# Altium footprint library BWRC.PcbLib: 51 footprints (part 1 of 4)
Each footprint in its own frame and in the unit in brackets; x right, y up, seen from the top. Pads: shape width x height; smd on the part's side, far side on the other; paste and mask are expansions set on the pad; w line width, h text height; cw(c..) or ccw(c..) is an arc to the next point about the centre after c.
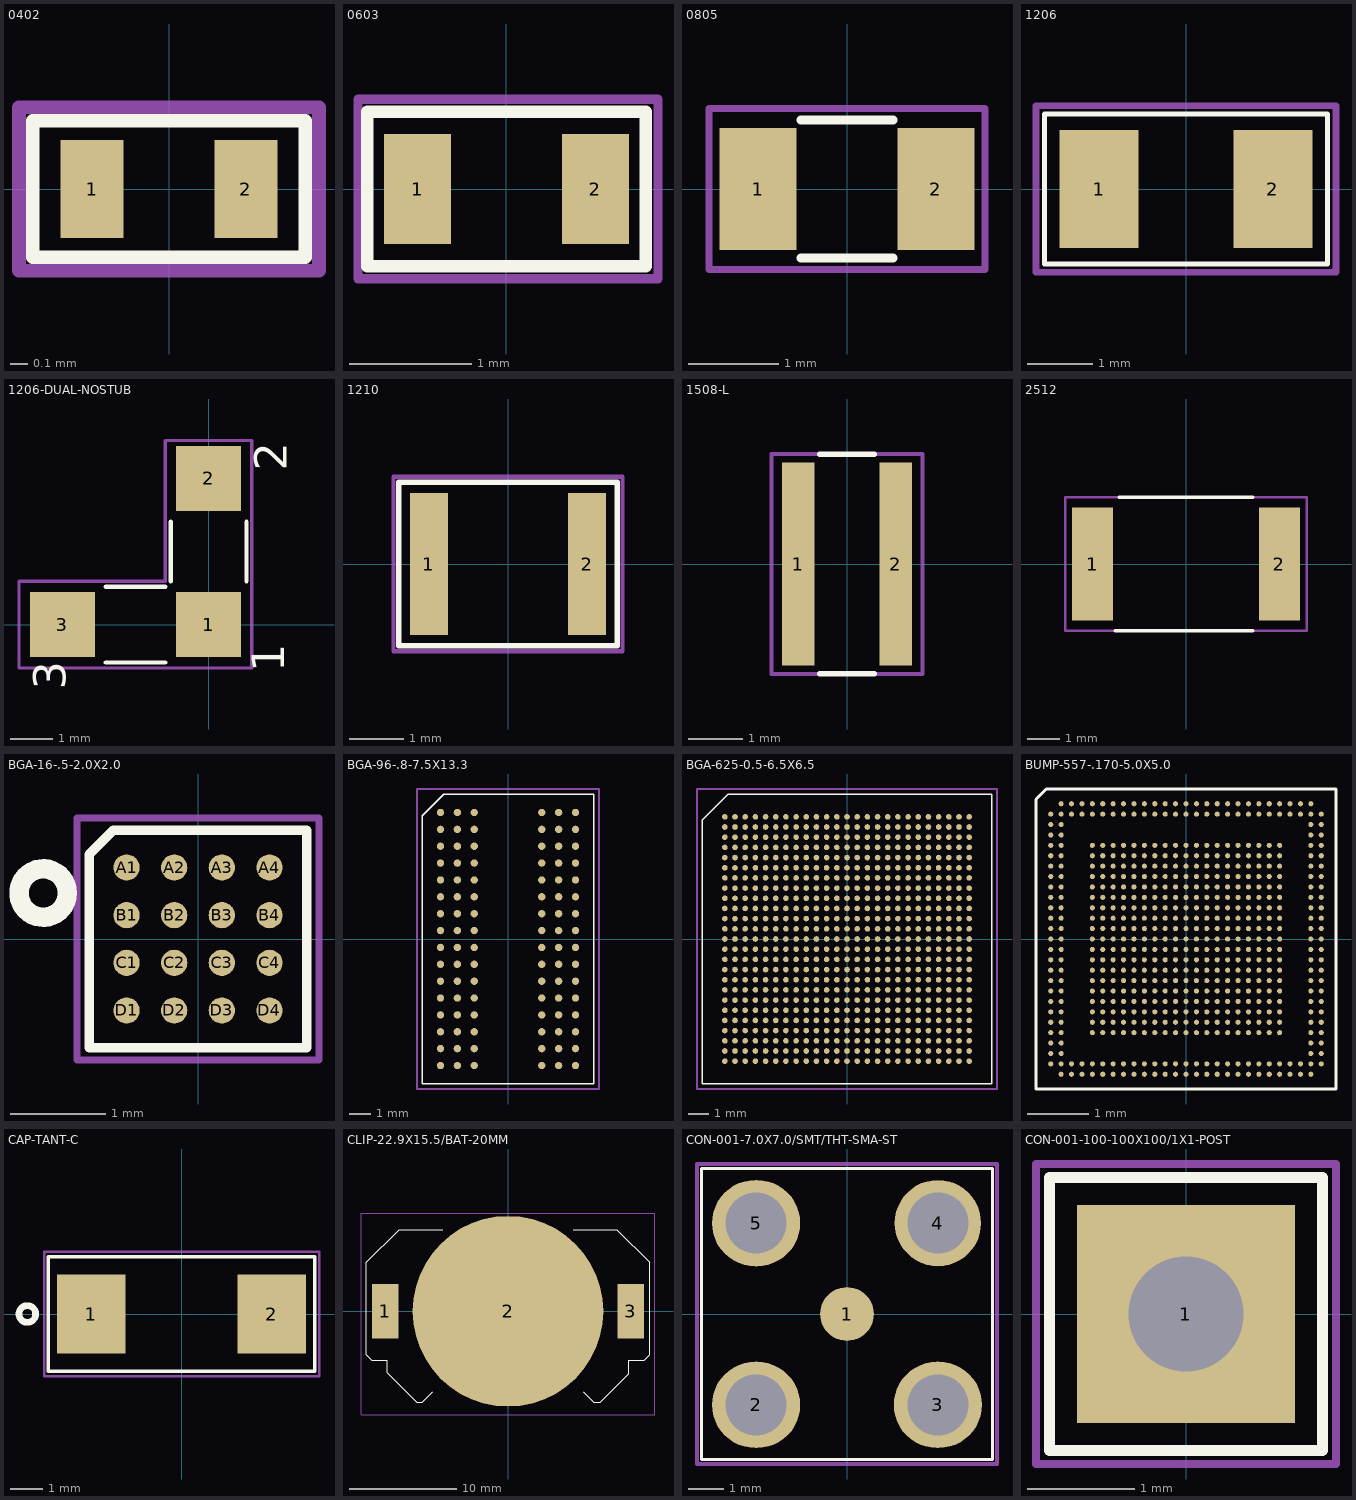
[diagram p0: the footprints below, top view; thin cyan lines are the x and y axes]

## 0402 [mm]
pads (2):
  rect 0.35x0.55 smd: 1(-0.43,0) 2(0.43,0)
Top Overlay:
  lines w0.076: -0.762,-0.381 0.762,-0.381 0.762,0.381 -0.762,0.381 -0.762,-0.381
M15_Courtyard_Top:
  lines w0.076: -0.838,-0.457 0.838,-0.457 0.838,0.457 -0.838,0.457 -0.838,-0.457

## 0603 [mm]
pads (2):
  rect 0.55x0.9 smd: 1(-0.73,0) 2(0.73,0)
Top Overlay:
  lines w0.102: -1.143,-0.635 -1.143,0.635 1.143,0.635 1.143,-0.635 -1.143,-0.635
M15_Courtyard_Top:
  lines w0.076: -1.219,-0.737 1.245,-0.737 1.245,0.737 -1.219,0.737 -1.219,-0.737

## 0805 [mm]
pads (2):
  rect 0.85x1.35 smd: 1(-0.98,0) 2(0.98,0)
Top Overlay:
  lines w0.102: -0.508,-0.762 0.508,-0.762 ; -0.508,0.762 0.508,0.762
M15_Courtyard_Top:
  lines w0.076: -1.524,-0.889 -1.524,-0.127 -1.524,0.889 1.524,0.889 1.524,-0.889 -1.524,-0.889

## 1206 [mm]
pads (2):
  rect 1.2x1.8 smd: 1(-1.325,0) 2(1.325,0)
Top Overlay:
  lines w0.076: -2.159,-1.143 -2.159,1.143 2.159,1.143 2.159,-1.143 -2.159,-1.143
M15_Courtyard_Top:
  lines w0.102: -2.286,-1.27 2.286,-1.27 2.286,1.27 -2.286,1.27 -2.286,-1.27

## 1206-DUAL-NOSTUB [mil]
height 43.31
pads (3):
  rect 60x60 smd: 1(0,-0.02) 2(0,134.98) 3(-135,-0.02)
Top Overlay:
  lines w4: -95,-35 -40,-35 ; -95,35 -40,35 ; -35,40 -35,95 ; 35,40 35,95
  text "2" at 72,142 h30
  text "3" at -132,-60 h30
  text "1" at 70,-44 h30
M15_Courtyard_Top:
  lines w3: -175,-40 -175,40 -40,40 -40,170 40,170 40,-40 -175,-40

## 1210 [mm]
pads (2):
  rect 0.7x2.6 smd: 1(-1.45,0) 2(1.45,0)
Top Overlay:
  lines w0.102: -2,-1.5 2,-1.5 2,1.5 -2,1.5 -2,-1.5
M15_Courtyard_Top:
  lines w0.076: -2.1,-1.6 -2.1,1.6 2.1,1.6 2.1,-1.6 -2.1,-1.6

## 1508-L [mm]
pads (2):
  rect 0.6x3.75 smd: 1(-0.9,0) 2(0.9,0)
Top Overlay:
  lines w0.102: -0.508,-2.032 0.508,-2.032 ; -0.508,2.032 0.508,2.032
M15_Courtyard_Top:
  lines w0.076: -1.397,-2.032 -1.397,2.032 1.397,2.032 1.397,-2.032 -1.397,-2.032

## 2512 [mm]
pads (2):
  rect 1.25x3.45 smd: 1(-2.85,0) 2(2.85,0)
Top Overlay:
  lines w0.102: -2.159,-2.032 2.032,-2.032 ; -2.032,2.032 2.032,2.032
M15_Courtyard_Top:
  lines w0.076: -3.683,-2.032 3.683,-2.032 3.683,2.032 -3.683,2.032 -3.683,-2.032

## BGA-16-.5-2.0X2.0 [mm]
pads (16):
  round 0.275 smd paste+0.025: A1(-0.75,0.75) A2(-0.25,0.75) A3(0.25,0.75) A4(0.75,0.75) B1(-0.75,0.25) B2(-0.25,0.25) B3(0.25,0.25) B4(0.75,0.25) C1(-0.75,-0.25) C2(-0.25,-0.25) C3(0.25,-0.25) C4(0.75,-0.25) D1(-0.75,-0.75) D2(-0.25,-0.75) D3(0.25,-0.75) D4(0.75,-0.75)
Top Overlay:
  circle w0.203: c-1.626,0.483 r0.254
  lines w0.102: -1.143,-1.143 1.143,-1.143 1.143,1.143 -0.889,1.143 -1.143,0.889 -1.143,-1.143
M15_Courtyard_Top:
  lines w0.076: -1.27,-1.27 -1.27,1.27 1.27,1.27 1.27,-1.27 -1.27,-1.27

## BGA-96-.8-7.5X13.3 [mm]
pads (96):
  round 0.35 smd paste+0.025: A1(-3.2,6) A2(-2.4,6) A3(-1.6,6) A7(1.6,6) A8(2.4,6) A9(3.2,6) B1(-3.2,5.2) B2(-2.4,5.2) B3(-1.6,5.2) B7(1.6,5.2) B8(2.4,5.2) B9(3.2,5.2) C1(-3.2,4.4) C2(-2.4,4.4) C3(-1.6,4.4) C7(1.6,4.4) C8(2.4,4.4) C9(3.2,4.4) D1(-3.2,3.6) D2(-2.4,3.6) D3(-1.6,3.6) D7(1.6,3.6) D8(2.4,3.6) D9(3.2,3.6) E1(-3.2,2.8) E2(-2.4,2.8) E3(-1.6,2.8) E7(1.6,2.8) E8(2.4,2.8) E9(3.2,2.8) F1(-3.2,2) F2(-2.4,2) F3(-1.6,2) F7(1.6,2) F8(2.4,2) F9(3.2,2) G1(-3.2,1.2) G2(-2.4,1.2) G3(-1.6,1.2) G7(1.6,1.2) G8(2.4,1.2) G9(3.2,1.2) H1(-3.2,0.4) H2(-2.4,0.4) H3(-1.6,0.4) H7(1.6,0.4) H8(2.4,0.4) H9(3.2,0.4) J1(-3.2,-0.4) J2(-2.4,-0.4) J3(-1.6,-0.4) J7(1.6,-0.4) J8(2.4,-0.4) J9(3.2,-0.4) K1(-3.2,-1.2) K2(-2.4,-1.2) K3(-1.6,-1.2) K7(1.6,-1.2) K8(2.4,-1.2) K9(3.2,-1.2) L1(-3.2,-2) L2(-2.4,-2) L3(-1.6,-2) L7(1.6,-2) L8(2.4,-2) L9(3.2,-2) M1(-3.2,-2.8) M2(-2.4,-2.8) M3(-1.6,-2.8) M7(1.6,-2.8) M8(2.4,-2.8) M9(3.2,-2.8) N1(-3.2,-3.6) N2(-2.4,-3.6) N3(-1.6,-3.6) N7(1.6,-3.6) N8(2.4,-3.6) N9(3.2,-3.6) P1(-3.2,-4.4) P2(-2.4,-4.4) P3(-1.6,-4.4) P7(1.6,-4.4) P8(2.4,-4.4) P9(3.2,-4.4) R1(-3.2,-5.2) R2(-2.4,-5.2) R3(-1.6,-5.2) R7(1.6,-5.2) R8(2.4,-5.2) R9(3.2,-5.2) T1(-3.2,-6) T2(-2.4,-6) T3(-1.6,-6) T7(1.6,-6) T8(2.4,-6) T9(3.2,-6)
Top Overlay:
  lines w0.076: -4.064,-6.858 -4.064,5.842 -3.048,6.858 4.064,6.858 4.064,-6.858 -4.064,-6.858
M15_Courtyard_Top:
  lines w0.102: -4.318,-7.112 4.318,-7.112 4.318,7.112 -4.318,7.112 -4.318,-7.112

## BGA-625-0.5-6.5X6.5 [mm]
pads (625):
  round 0.275 smd paste+0.025: A1(-6,6) A2(-5.5,6) A3(-5,6) A4(-4.5,6) A5(-4,6) A6(-3.5,6) A7(-3,6) A8(-2.5,6) A9(-2,6) A10(-1.5,6) A11(-1,6) A12(-0.5,6) A13(0,6) A14(0.5,6) A15(1,6) A16(1.5,6) A17(2,6) A18(2.5,6) A19(3,6) A20(3.5,6) A21(4,6) A22(4.5,6) A23(5,6) A24(5.5,6) A25(6,6) AA1(-6,-4) AA2(-5.5,-4) AA3(-5,-4) AA4(-4.5,-4) AA5(-4,-4) AA6(-3.5,-4) AA7(-3,-4) AA8(-2.5,-4) AA9(-2,-4) AA10(-1.5,-4) AA11(-1,-4) AA12(-0.5,-4) AA13(0,-4) AA14(0.5,-4) AA15(1,-4) AA16(1.5,-4) AA17(2,-4) AA18(2.5,-4) AA19(3,-4) AA20(3.5,-4) AA21(4,-4) AA22(4.5,-4) AA23(5,-4) AA24(5.5,-4) AA25(6,-4) AB1(-6,-4.5) AB2(-5.5,-4.5) AB3(-5,-4.5) AB4(-4.5,-4.5) AB5(-4,-4.5) AB6(-3.5,-4.5) AB7(-3,-4.5) AB8(-2.5,-4.5) AB9(-2,-4.5) AB10(-1.5,-4.5) AB11(-1,-4.5) AB12(-0.5,-4.5) AB13(0,-4.5) AB14(0.5,-4.5) AB15(1,-4.5) AB16(1.5,-4.5) AB17(2,-4.5) AB18(2.5,-4.5) AB19(3,-4.5) AB20(3.5,-4.5) AB21(4,-4.5) AB22(4.5,-4.5) AB23(5,-4.5) AB24(5.5,-4.5) AB25(6,-4.5) AC1(-6,-5) AC2(-5.5,-5) AC3(-5,-5) AC4(-4.5,-5) AC5(-4,-5) AC6(-3.5,-5) AC7(-3,-5) AC8(-2.5,-5) AC9(-2,-5) AC10(-1.5,-5) AC11(-1,-5) AC12(-0.5,-5) AC13(0,-5) AC14(0.5,-5) AC15(1,-5) AC16(1.5,-5) AC17(2,-5) AC18(2.5,-5) AC19(3,-5) AC20(3.5,-5) AC21(4,-5) AC22(4.5,-5) AC23(5,-5) AC24(5.5,-5) AC25(6,-5) AD1(-6,-5.5) AD2(-5.5,-5.5) AD3(-5,-5.5) AD4(-4.5,-5.5) AD5(-4,-5.5) AD6(-3.5,-5.5) AD7(-3,-5.5) AD8(-2.5,-5.5) AD9(-2,-5.5) AD10(-1.5,-5.5) AD11(-1,-5.5) AD12(-0.5,-5.5) AD13(0,-5.5) AD14(0.5,-5.5) AD15(1,-5.5) AD16(1.5,-5.5) AD17(2,-5.5) AD18(2.5,-5.5) AD19(3,-5.5) AD20(3.5,-5.5) AD21(4,-5.5) AD22(4.5,-5.5) AD23(5,-5.5) AD24(5.5,-5.5) AD25(6,-5.5) AE1(-6,-6) AE2(-5.5,-6) AE3(-5,-6) AE4(-4.5,-6) AE5(-4,-6) AE6(-3.5,-6) AE7(-3,-6) AE8(-2.5,-6) AE9(-2,-6) AE10(-1.5,-6) AE11(-1,-6) AE12(-0.5,-6) AE13(0,-6) AE14(0.5,-6) AE15(1,-6) AE16(1.5,-6) AE17(2,-6) AE18(2.5,-6) AE19(3,-6) AE20(3.5,-6) AE21(4,-6) AE22(4.5,-6) AE23(5,-6) AE24(5.5,-6) AE25(6,-6) B1(-6,5.5) B2(-5.5,5.5) B3(-5,5.5) B4(-4.5,5.5) B5(-4,5.5) B6(-3.5,5.5) B7(-3,5.5) B8(-2.5,5.5) B9(-2,5.5) B10(-1.5,5.5) B11(-1,5.5) B12(-0.5,5.5) B13(0,5.5) B14(0.5,5.5) B15(1,5.5) B16(1.5,5.5) B17(2,5.5) B18(2.5,5.5) B19(3,5.5) B20(3.5,5.5) B21(4,5.5) B22(4.5,5.5) B23(5,5.5) B24(5.5,5.5) B25(6,5.5) C1(-6,5) C2(-5.5,5) C3(-5,5) C4(-4.5,5) C5(-4,5) C6(-3.5,5) C7(-3,5) C8(-2.5,5) C9(-2,5) C10(-1.5,5) C11(-1,5) C12(-0.5,5) C13(0,5) C14(0.5,5) C15(1,5) C16(1.5,5) C17(2,5) C18(2.5,5) C19(3,5) C20(3.5,5) C21(4,5) C22(4.5,5) C23(5,5) C24(5.5,5) C25(6,5) D1(-6,4.5) D2(-5.5,4.5) D3(-5,4.5) D4(-4.5,4.5) D5(-4,4.5) D6(-3.5,4.5) D7(-3,4.5) D8(-2.5,4.5) D9(-2,4.5) D10(-1.5,4.5) D11(-1,4.5) D12(-0.5,4.5) D13(0,4.5) D14(0.5,4.5) D15(1,4.5) D16(1.5,4.5) D17(2,4.5) D18(2.5,4.5) D19(3,4.5) D20(3.5,4.5) D21(4,4.5) D22(4.5,4.5) D23(5,4.5) D24(5.5,4.5) D25(6,4.5) E1(-6,4) E2(-5.5,4) E3(-5,4) E4(-4.5,4) E5(-4,4) E6(-3.5,4) E7(-3,4) E8(-2.5,4) E9(-2,4) E10(-1.5,4) E11(-1,4) E12(-0.5,4) E13(0,4) E14(0.5,4) E15(1,4) E16(1.5,4) E17(2,4) E18(2.5,4) E19(3,4) E20(3.5,4) E21(4,4) E22(4.5,4) E23(5,4) E24(5.5,4) E25(6,4) F1(-6,3.5) F2(-5.5,3.5) F3(-5,3.5) F4(-4.5,3.5) F5(-4,3.5) F6(-3.5,3.5) F7(-3,3.5) F8(-2.5,3.5) F9(-2,3.5) F10(-1.5,3.5) F11(-1,3.5) F12(-0.5,3.5) F13(0,3.5) F14(0.5,3.5) F15(1,3.5) F16(1.5,3.5) F17(2,3.5) F18(2.5,3.5) F19(3,3.5) F20(3.5,3.5) F21(4,3.5) F22(4.5,3.5) F23(5,3.5) F24(5.5,3.5) F25(6,3.5) G1(-6,3) G2(-5.5,3) G3(-5,3) G4(-4.5,3) G5(-4,3) G6(-3.5,3) G7(-3,3) G8(-2.5,3) G9(-2,3) G10(-1.5,3) G11(-1,3) G12(-0.5,3) G13(0,3) G14(0.5,3) G15(1,3) G16(1.5,3) G17(2,3) G18(2.5,3) G19(3,3) G20(3.5,3) G21(4,3) G22(4.5,3) G23(5,3) G24(5.5,3) G25(6,3) H1(-6,2.5) H2(-5.5,2.5) H3(-5,2.5) H4(-4.5,2.5) H5(-4,2.5) H6(-3.5,2.5) H7(-3,2.5) H8(-2.5,2.5) H9(-2,2.5) H10(-1.5,2.5) H11(-1,2.5) H12(-0.5,2.5) H13(0,2.5) H14(0.5,2.5) H15(1,2.5) H16(1.5,2.5) H17(2,2.5) H18(2.5,2.5) H19(3,2.5) H20(3.5,2.5) H21(4,2.5) H22(4.5,2.5) H23(5,2.5) H24(5.5,2.5) H25(6,2.5) J1(-6,2) J2(-5.5,2) J3(-5,2) J4(-4.5,2) J5(-4,2) J6(-3.5,2) J7(-3,2) J8(-2.5,2) J9(-2,2) J10(-1.5,2) J11(-1,2) J12(-0.5,2) J13(0,2) J14(0.5,2) J15(1,2) J16(1.5,2) J17(2,2) J18(2.5,2) J19(3,2) J20(3.5,2) J21(4,2) J22(4.5,2) J23(5,2) J24(5.5,2) J25(6,2) K1(-6,1.5) K2(-5.5,1.5) K3(-5,1.5) K4(-4.5,1.5) K5(-4,1.5) K6(-3.5,1.5) K7(-3,1.5) K8(-2.5,1.5) K9(-2,1.5) K10(-1.5,1.5) K11(-1,1.5) K12(-0.5,1.5) K13(0,1.5) K14(0.5,1.5) K15(1,1.5) K16(1.5,1.5) K17(2,1.5) K18(2.5,1.5) K19(3,1.5) K20(3.5,1.5) K21(4,1.5) K22(4.5,1.5) K23(5,1.5) K24(5.5,1.5) K25(6,1.5) L1(-6,1) L2(-5.5,1) L3(-5,1) L4(-4.5,1) L5(-4,1) L6(-3.5,1) L7(-3,1) L8(-2.5,1) L9(-2,1) L10(-1.5,1) L11(-1,1) L12(-0.5,1) L13(0,1) L14(0.5,1) L15(1,1) L16(1.5,1) L17(2,1) L18(2.5,1) L19(3,1) L20(3.5,1) L21(4,1) L22(4.5,1) L23(5,1) L24(5.5,1) L25(6,1) M1(-6,0.5) M2(-5.5,0.5) M3(-5,0.5) M4(-4.5,0.5) M5(-4,0.5) M6(-3.5,0.5) M7(-3,0.5) M8(-2.5,0.5) M9(-2,0.5) M10(-1.5,0.5) M11(-1,0.5) M12(-0.5,0.5) M13(0,0.5) M14(0.5,0.5) M15(1,0.5) M16(1.5,0.5) M17(2,0.5) M18(2.5,0.5) M19(3,0.5) M20(3.5,0.5) M21(4,0.5) M22(4.5,0.5) M23(5,0.5) M24(5.5,0.5) M25(6,0.5) N1(-6,0) N2(-5.5,0) N3(-5,0) N4(-4.5,0) N5(-4,0) N6(-3.5,0) N7(-3,0) N8(-2.5,0) N9(-2,0) N10(-1.5,0) N11(-1,0) N12(-0.5,0) N13(0,0) N14(0.5,0) N15(1,0) N16(1.5,0) N17(2,0) N18(2.5,0) N19(3,0) N20(3.5,0) N21(4,0) N22(4.5,0) N23(5,0) N24(5.5,0) N25(6,0) P1(-6,-0.5) P2(-5.5,-0.5) P3(-5,-0.5) P4(-4.5,-0.5) P5(-4,-0.5) P6(-3.5,-0.5) P7(-3,-0.5) P8(-2.5,-0.5) P9(-2,-0.5) P10(-1.5,-0.5) P11(-1,-0.5) P12(-0.5,-0.5) P13(0,-0.5) P14(0.5,-0.5) P15(1,-0.5) P16(1.5,-0.5) P17(2,-0.5) P18(2.5,-0.5) P19(3,-0.5) P20(3.5,-0.5) P21(4,-0.5) P22(4.5,-0.5) P23(5,-0.5) P24(5.5,-0.5) P25(6,-0.5) R1(-6,-1) R2(-5.5,-1) R3(-5,-1) R4(-4.5,-1) R5(-4,-1) R6(-3.5,-1) R7(-3,-1) R8(-2.5,-1) R9(-2,-1) R10(-1.5,-1) R11(-1,-1) R12(-0.5,-1) R13(0,-1) R14(0.5,-1) R15(1,-1) R16(1.5,-1) R17(2,-1) R18(2.5,-1) R19(3,-1) R20(3.5,-1) R21(4,-1) R22(4.5,-1) R23(5,-1) R24(5.5,-1) R25(6,-1) T1(-6,-1.5) T2(-5.5,-1.5) T3(-5,-1.5) T4(-4.5,-1.5) T5(-4,-1.5) T6(-3.5,-1.5) T7(-3,-1.5) T8(-2.5,-1.5) T9(-2,-1.5) T10(-1.5,-1.5) T11(-1,-1.5) T12(-0.5,-1.5) T13(0,-1.5) T14(0.5,-1.5) T15(1,-1.5) T16(1.5,-1.5) T17(2,-1.5) T18(2.5,-1.5) T19(3,-1.5) T20(3.5,-1.5) T21(4,-1.5) T22(4.5,-1.5) T23(5,-1.5) T24(5.5,-1.5) T25(6,-1.5) U1(-6,-2) U2(-5.5,-2) U3(-5,-2) U4(-4.5,-2) U5(-4,-2) U6(-3.5,-2) U7(-3,-2) U8(-2.5,-2) U9(-2,-2) U10(-1.5,-2) U11(-1,-2) U12(-0.5,-2) U13(0,-2) U14(0.5,-2) U15(1,-2) U16(1.5,-2) U17(2,-2) U18(2.5,-2) U19(3,-2) U20(3.5,-2) U21(4,-2) U22(4.5,-2) U23(5,-2) U24(5.5,-2) U25(6,-2) V1(-6,-2.5) V2(-5.5,-2.5) V3(-5,-2.5) V4(-4.5,-2.5) V5(-4,-2.5) V6(-3.5,-2.5) V7(-3,-2.5) V8(-2.5,-2.5) V9(-2,-2.5) V10(-1.5,-2.5) V11(-1,-2.5) V12(-0.5,-2.5) V13(0,-2.5) V14(0.5,-2.5) V15(1,-2.5) V16(1.5,-2.5) V17(2,-2.5) V18(2.5,-2.5) V19(3,-2.5) V20(3.5,-2.5) V21(4,-2.5) V22(4.5,-2.5) V23(5,-2.5) V24(5.5,-2.5) V25(6,-2.5) W1(-6,-3) W2(-5.5,-3) W3(-5,-3) W4(-4.5,-3) W5(-4,-3) W6(-3.5,-3) W7(-3,-3) W8(-2.5,-3) W9(-2,-3) W10(-1.5,-3) W11(-1,-3) W12(-0.5,-3) W13(0,-3) W14(0.5,-3) W15(1,-3) W16(1.5,-3) W17(2,-3) W18(2.5,-3) W19(3,-3) W20(3.5,-3) W21(4,-3) W22(4.5,-3) W23(5,-3) W24(5.5,-3) W25(6,-3) Y1(-6,-3.5) Y2(-5.5,-3.5) Y3(-5,-3.5) Y4(-4.5,-3.5) Y5(-4,-3.5) Y6(-3.5,-3.5) Y7(-3,-3.5) Y8(-2.5,-3.5) Y9(-2,-3.5) Y10(-1.5,-3.5) Y11(-1,-3.5) Y12(-0.5,-3.5) Y13(0,-3.5) Y14(0.5,-3.5) Y15(1,-3.5) Y16(1.5,-3.5) Y17(2,-3.5) Y18(2.5,-3.5) Y19(3,-3.5) Y20(3.5,-3.5) Y21(4,-3.5) Y22(4.5,-3.5) Y23(5,-3.5) Y24(5.5,-3.5) Y25(6,-3.5)
Top Overlay:
  lines w0.076: -7.112,-7.112 7.112,-7.112 7.112,7.112 -5.842,7.112 -7.112,5.842 -7.112,-7.112
M15_Courtyard_Top:
  lines w0.102: -7.366,-7.366 -7.366,7.366 7.366,7.366 7.366,-7.366 -7.366,-7.366

## BUMP-557-.170-5.0X5.0 [mm]
pads (557):
  round 0.083 smd: A2(-2.04,2.21) A3(-1.87,2.21) A4(-1.7,2.21) A5(-1.53,2.21) A6(-1.36,2.21) A7(-1.19,2.21) A8(-1.02,2.21) A9(-0.85,2.21) A10(-0.68,2.21) A11(-0.51,2.21) A12(-0.34,2.21) A13(-0.17,2.21) A14(0,2.21) A15(0.17,2.21) A16(0.34,2.21) A17(0.51,2.21) A18(0.68,2.21) A19(0.85,2.21) A20(1.02,2.21) A21(1.19,2.21) A22(1.36,2.21) A23(1.53,2.21) A24(1.7,2.21) A25(1.87,2.21) A26(2.04,2.21) AA1(-2.21,-1.19) AA2(-2.04,-1.19) AA5(-1.53,-1.19) AA6(-1.36,-1.19) AA7(-1.19,-1.19) AA8(-1.02,-1.19) AA9(-0.85,-1.19) AA10(-0.68,-1.19) AA11(-0.51,-1.19) AA12(-0.34,-1.19) AA13(-0.17,-1.19) AA14(0,-1.19) AA15(0.17,-1.19) AA16(0.34,-1.19) AA17(0.51,-1.19) AA18(0.68,-1.19) AA19(0.85,-1.19) AA20(1.02,-1.19) AA21(1.19,-1.19) AA22(1.36,-1.19) AA23(1.53,-1.19) AA26(2.04,-1.19) AA27(2.21,-1.19) AB1(-2.21,-1.36) AB2(-2.04,-1.36) AB5(-1.53,-1.36) AB6(-1.36,-1.36) AB7(-1.19,-1.36) AB8(-1.02,-1.36) AB9(-0.85,-1.36) AB10(-0.68,-1.36) AB11(-0.51,-1.36) AB12(-0.34,-1.36) AB13(-0.17,-1.36) AB14(0,-1.36) AB15(0.17,-1.36) AB16(0.34,-1.36) AB17(0.51,-1.36) AB18(0.68,-1.36) AB19(0.85,-1.36) AB20(1.02,-1.36) AB21(1.19,-1.36) AB22(1.36,-1.36) AB23(1.53,-1.36) AB26(2.04,-1.36) AB27(2.21,-1.36) AC1(-2.21,-1.53) AC2(-2.04,-1.53) AC5(-1.53,-1.53) AC6(-1.36,-1.53) AC7(-1.19,-1.53) AC8(-1.02,-1.53) AC9(-0.85,-1.53) AC10(-0.68,-1.53) AC11(-0.51,-1.53) AC12(-0.34,-1.53) AC13(-0.17,-1.53) AC14(0,-1.53) AC15(0.17,-1.53) AC16(0.34,-1.53) AC17(0.51,-1.53) AC18(0.68,-1.53) AC19(0.85,-1.53) AC20(1.02,-1.53) AC21(1.19,-1.53) AC22(1.36,-1.53) AC23(1.53,-1.53) AC26(2.04,-1.53) AC27(2.21,-1.53) AD1(-2.21,-1.7) AD2(-2.04,-1.7) AD26(2.04,-1.7) AD27(2.21,-1.7) AE1(-2.21,-1.87) AE2(-2.04,-1.87) AE26(2.04,-1.87) AE27(2.21,-1.87) AF1(-2.21,-2.04) AF2(-2.04,-2.04) AF3(-1.87,-2.04) AF4(-1.7,-2.04) AF5(-1.53,-2.04) AF6(-1.36,-2.04) AF7(-1.19,-2.04) AF8(-1.02,-2.04) AF9(-0.85,-2.04) AF10(-0.68,-2.04) AF11(-0.51,-2.04) AF12(-0.34,-2.04) AF13(-0.17,-2.04) AF14(0,-2.04) AF15(0.17,-2.04) AF16(0.34,-2.04) AF17(0.51,-2.04) AF18(0.68,-2.04) AF19(0.85,-2.04) AF20(1.02,-2.04) AF21(1.19,-2.04) AF22(1.36,-2.04) AF23(1.53,-2.04) AF24(1.7,-2.04) AF25(1.87,-2.04) AF26(2.04,-2.04) AF27(2.21,-2.04) AG2(-2.04,-2.21) AG3(-1.87,-2.21) AG4(-1.7,-2.21) AG5(-1.53,-2.21) AG6(-1.36,-2.21) AG7(-1.19,-2.21) AG8(-1.02,-2.21) AG9(-0.85,-2.21) AG10(-0.68,-2.21) AG11(-0.51,-2.21) AG12(-0.34,-2.21) AG13(-0.17,-2.21) AG14(0,-2.21) AG15(0.17,-2.21) AG16(0.34,-2.21) AG17(0.51,-2.21) AG18(0.68,-2.21) AG19(0.85,-2.21) AG20(1.02,-2.21) AG21(1.19,-2.21) AG22(1.36,-2.21) AG23(1.53,-2.21) AG24(1.7,-2.21) AG25(1.87,-2.21) AG26(2.04,-2.21) B1(-2.21,2.04) B2(-2.04,2.04) B3(-1.87,2.04) B4(-1.7,2.04) B5(-1.53,2.04) B6(-1.36,2.04) B7(-1.19,2.04) B8(-1.02,2.04) B9(-0.85,2.04) B10(-0.68,2.04) B11(-0.51,2.04) B12(-0.34,2.04) B13(-0.17,2.04) B14(0,2.04) B15(0.17,2.04) B16(0.34,2.04) B17(0.51,2.04) B18(0.68,2.04) B19(0.85,2.04) B20(1.02,2.04) B21(1.19,2.04) B22(1.36,2.04) B23(1.53,2.04) B24(1.7,2.04) B25(1.87,2.04) B26(2.04,2.04) B27(2.21,2.04) C1(-2.21,1.87) C2(-2.04,1.87) C26(2.04,1.87) C27(2.21,1.87) D1(-2.21,1.7) D2(-2.04,1.7) D26(2.04,1.7) D27(2.21,1.7) E1(-2.21,1.53) E2(-2.04,1.53) E5(-1.53,1.53) E6(-1.36,1.53) E7(-1.19,1.53) E8(-1.02,1.53) E9(-0.85,1.53) E10(-0.68,1.53) E11(-0.51,1.53) E12(-0.34,1.53) E13(-0.17,1.53) E14(0,1.53) E15(0.17,1.53) E16(0.34,1.53) E17(0.51,1.53) E18(0.68,1.53) E19(0.85,1.53) E20(1.02,1.53) E21(1.19,1.53) E22(1.36,1.53) E23(1.53,1.53) E26(2.04,1.53) E27(2.21,1.53) F1(-2.21,1.36) F2(-2.04,1.36) F5(-1.53,1.36) F6(-1.36,1.36) F7(-1.19,1.36) F8(-1.02,1.36) F9(-0.85,1.36) F10(-0.68,1.36) F11(-0.51,1.36) F12(-0.34,1.36) F13(-0.17,1.36) F14(0,1.36) F15(0.17,1.36) F16(0.34,1.36) F17(0.51,1.36) F18(0.68,1.36) F19(0.85,1.36) F20(1.02,1.36) F21(1.19,1.36) F22(1.36,1.36) F23(1.53,1.36) F26(2.04,1.36) F27(2.21,1.36) G1(-2.21,1.19) G2(-2.04,1.19) G5(-1.53,1.19) G6(-1.36,1.19) G7(-1.19,1.19) G8(-1.02,1.19) G9(-0.85,1.19) G10(-0.68,1.19) G11(-0.51,1.19) G12(-0.34,1.19) G13(-0.17,1.19) G14(0,1.19) G15(0.17,1.19) G16(0.34,1.19) G17(0.51,1.19) G18(0.68,1.19) G19(0.85,1.19) G20(1.02,1.19) G21(1.19,1.19) G22(1.36,1.19) G23(1.53,1.19) G26(2.04,1.19) G27(2.21,1.19) H1(-2.21,1.02) H2(-2.04,1.02) H5(-1.53,1.02) H6(-1.36,1.02) H7(-1.19,1.02) H8(-1.02,1.02) H9(-0.85,1.02) H10(-0.68,1.02) H11(-0.51,1.02) H12(-0.34,1.02) H13(-0.17,1.02) H14(0,1.02) H15(0.17,1.02) H16(0.34,1.02) H17(0.51,1.02) H18(0.68,1.02) H19(0.85,1.02) H20(1.02,1.02) H21(1.19,1.02) H22(1.36,1.02) H23(1.53,1.02) H26(2.04,1.02) H27(2.21,1.02) J1(-2.21,0.85) J2(-2.04,0.85) J5(-1.53,0.85) J6(-1.36,0.85) J7(-1.19,0.85) J8(-1.02,0.85) J9(-0.85,0.85) J10(-0.68,0.85) J11(-0.51,0.85) J12(-0.34,0.85) J13(-0.17,0.85) J14(0,0.85) J15(0.17,0.85) J16(0.34,0.85) J17(0.51,0.85) J18(0.68,0.85) J19(0.85,0.85) J20(1.02,0.85) J21(1.19,0.85) J22(1.36,0.85) J23(1.53,0.85) J26(2.04,0.85) J27(2.21,0.85) K1(-2.21,0.68) K2(-2.04,0.68) K5(-1.53,0.68) K6(-1.36,0.68) K7(-1.19,0.68) K8(-1.02,0.68) K9(-0.85,0.68) K10(-0.68,0.68) K11(-0.51,0.68) K12(-0.34,0.68) K13(-0.17,0.68) K14(0,0.68) K15(0.17,0.68) K16(0.34,0.68) K17(0.51,0.68) K18(0.68,0.68) K19(0.85,0.68) K20(1.02,0.68) K21(1.19,0.68) K22(1.36,0.68) K23(1.53,0.68) K26(2.04,0.68) K27(2.21,0.68) L1(-2.21,0.51) L2(-2.04,0.51) L5(-1.53,0.51) L6(-1.36,0.51) L7(-1.19,0.51) L8(-1.02,0.51) L9(-0.85,0.51) L10(-0.68,0.51) L11(-0.51,0.51) L12(-0.34,0.51) L13(-0.17,0.51) L14(0,0.51) L15(0.17,0.51) L16(0.34,0.51) L17(0.51,0.51) L18(0.68,0.51) L19(0.85,0.51) L20(1.02,0.51) L21(1.19,0.51) L22(1.36,0.51) L23(1.53,0.51) L26(2.04,0.51) L27(2.21,0.51) M1(-2.21,0.34) M2(-2.04,0.34) M5(-1.53,0.34) M6(-1.36,0.34) M7(-1.19,0.34) M8(-1.02,0.34) M9(-0.85,0.34) M10(-0.68,0.34) M11(-0.51,0.34) M12(-0.34,0.34) M13(-0.17,0.34) M14(0,0.34) M15(0.17,0.34) M16(0.34,0.34) M17(0.51,0.34) M18(0.68,0.34) M19(0.85,0.34) M20(1.02,0.34) M21(1.19,0.34) M22(1.36,0.34) M23(1.53,0.34) M26(2.04,0.34) M27(2.21,0.34) N1(-2.21,0.17) N2(-2.04,0.17) N5(-1.53,0.17) N6(-1.36,0.17) N7(-1.19,0.17) N8(-1.02,0.17) N9(-0.85,0.17) N10(-0.68,0.17) N11(-0.51,0.17) N12(-0.34,0.17) N13(-0.17,0.17) N14(0,0.17) N15(0.17,0.17) N16(0.34,0.17) N17(0.51,0.17) N18(0.68,0.17) N19(0.85,0.17) N20(1.02,0.17) N21(1.19,0.17) N22(1.36,0.17) N23(1.53,0.17) N26(2.04,0.17) N27(2.21,0.17) P1(-2.21,0) P2(-2.04,0) P5(-1.53,0) P6(-1.36,0) P7(-1.19,0) P8(-1.02,0) P9(-0.85,0) P10(-0.68,0) P11(-0.51,0) P12(-0.34,0) P13(-0.17,0) P14(0,0) P15(0.17,0) P16(0.34,0) P17(0.51,0) P18(0.68,0) P19(0.85,0) P20(1.02,0) P21(1.19,0) P22(1.36,0) P23(1.53,0) P26(2.04,0) P27(2.21,0) R1(-2.21,-0.17) R2(-2.04,-0.17) R5(-1.53,-0.17) R6(-1.36,-0.17) R7(-1.19,-0.17) R8(-1.02,-0.17) R9(-0.85,-0.17) R10(-0.68,-0.17) R11(-0.51,-0.17) R12(-0.34,-0.17) R13(-0.17,-0.17) R14(0,-0.17) R15(0.17,-0.17) R16(0.34,-0.17) R17(0.51,-0.17) R18(0.68,-0.17) R19(0.85,-0.17) R20(1.02,-0.17) R21(1.19,-0.17) R22(1.36,-0.17) R23(1.53,-0.17) R26(2.04,-0.17) R27(2.21,-0.17) T1(-2.21,-0.34) T2(-2.04,-0.34) T5(-1.53,-0.34) T6(-1.36,-0.34) T7(-1.19,-0.34) T8(-1.02,-0.34) T9(-0.85,-0.34) T10(-0.68,-0.34) T11(-0.51,-0.34) T12(-0.34,-0.34) T13(-0.17,-0.34) T14(0,-0.34) T15(0.17,-0.34) T16(0.34,-0.34) T17(0.51,-0.34) T18(0.68,-0.34) T19(0.85,-0.34) T20(1.02,-0.34) T21(1.19,-0.34) T22(1.36,-0.34) T23(1.53,-0.34) T26(2.04,-0.34) T27(2.21,-0.34) U1(-2.21,-0.51) U2(-2.04,-0.51) U5(-1.53,-0.51) U6(-1.36,-0.51) U7(-1.19,-0.51) U8(-1.02,-0.51) U9(-0.85,-0.51) U10(-0.68,-0.51) U11(-0.51,-0.51) U12(-0.34,-0.51) U13(-0.17,-0.51) U14(0,-0.51) U15(0.17,-0.51) U16(0.34,-0.51) U17(0.51,-0.51) U18(0.68,-0.51) U19(0.85,-0.51) U20(1.02,-0.51) U21(1.19,-0.51) U22(1.36,-0.51) U23(1.53,-0.51) U26(2.04,-0.51) U27(2.21,-0.51) V1(-2.21,-0.68) V2(-2.04,-0.68) V5(-1.53,-0.68) V6(-1.36,-0.68) V7(-1.19,-0.68) V8(-1.02,-0.68) V9(-0.85,-0.68) V10(-0.68,-0.68) V11(-0.51,-0.68) V12(-0.34,-0.68) V13(-0.17,-0.68) V14(0,-0.68) V15(0.17,-0.68) V16(0.34,-0.68) V17(0.51,-0.68) V18(0.68,-0.68) V19(0.85,-0.68) V20(1.02,-0.68) V21(1.19,-0.68) V22(1.36,-0.68) V23(1.53,-0.68) V26(2.04,-0.68) V27(2.21,-0.68) W1(-2.21,-0.85) W2(-2.04,-0.85) W5(-1.53,-0.85) W6(-1.36,-0.85) W7(-1.19,-0.85) W8(-1.02,-0.85) W9(-0.85,-0.85) W10(-0.68,-0.85) W11(-0.51,-0.85) W12(-0.34,-0.85) W13(-0.17,-0.85) W14(0,-0.85) W15(0.17,-0.85) W16(0.34,-0.85) W17(0.51,-0.85) W18(0.68,-0.85) W19(0.85,-0.85) W20(1.02,-0.85) W21(1.19,-0.85) W22(1.36,-0.85) W23(1.53,-0.85) W26(2.04,-0.85) W27(2.21,-0.85) Y1(-2.21,-1.02) Y2(-2.04,-1.02) Y5(-1.53,-1.02) Y6(-1.36,-1.02) Y7(-1.19,-1.02) Y8(-1.02,-1.02) Y9(-0.85,-1.02) Y10(-0.68,-1.02) Y11(-0.51,-1.02) Y12(-0.34,-1.02) Y13(-0.17,-1.02) Y14(0,-1.02) Y15(0.17,-1.02) Y16(0.34,-1.02) Y17(0.51,-1.02) Y18(0.68,-1.02) Y19(0.85,-1.02) Y20(1.02,-1.02) Y21(1.19,-1.02) Y22(1.36,-1.02) Y23(1.53,-1.02) Y26(2.04,-1.02) Y27(2.21,-1.02)
Top Overlay:
  lines w0.051: -2.451,-2.451 -2.451,2.281 -2.281,2.451 2.451,2.451 2.451,-2.451 -2.451,-2.451

## CAP-TANT-C [mm]
pads (2):
  rect 2.1x2.4 smd: 1(-2.75,0) 2(2.75,0)
Top Overlay:
  circle w0.203: c-4.699,0 r0.254
  lines w0.102: -4.064,-1.75 -4.064,1.75 4.064,1.75 4.064,-1.75 -4.064,-1.75
M15_Courtyard_Top:
  lines w0.076: -4.191,-1.905 -4.191,1.905 4.191,1.905 4.191,-1.905 -4.191,-1.905

## CLIP-22.9X15.5/BAT-20MM [mm]
pads (3):
  rect 2.5x5.1 smd: 1(-11.45,0) 3(11.45,0)
  round 17.8 smd paste-8.9: 2(0,0)
Top Overlay:
  lines w0.102: -7,-7.5 -8,-8.5 -8.5,-8.5 -11.25,-5.75 -11.25,-4.572 -12.7,-4.572 -13.208,-4.064 -13.208,4.572 -10.16,7.62 -6.096,7.62 ; 6.096,7.62 10.16,7.62 13.208,4.572 13.208,-4.064 12.7,-4.572 11.25,-4.572 11.25,-5.85 8.6,-8.5 8,-8.5 7,-7.5
M15_Courtyard_Top:
  lines w0.076: -13.716,-9.652 13.716,-9.652 13.716,9.144 -13.716,9.144 -13.716,-9.652

## CON-001-7.0X7.0/SMT/THT-SMA-ST [mil]
pads (5):
  oval 59x58.98 smd: 1(0,0)
  oval 97x94.96 hole 67: 2(-100,-100) 3(100,-100) 5(-100,100)
  round 94.96 hole 67: 4(100,100)
Top Overlay:
  lines w3: -160,-160 160,-160 160,160 72.4,160 -72.4,160 -160,160 -160,-160
M15_Courtyard_Top:
  lines w4: -165,-165 165,-165 165,135 165,165 -165,165 -165,-165

## CON-001-100-100X100/1X1-POST [mil] "1 pin"
height 43.31
pads (1):
  rect 80x80 hole 42: 1(0,0)
Top Overlay:
  lines w4: -50,-50 50,-50 50,50 -50,50 -50,-50
M15_Courtyard_Top:
  lines w3: -55,-55 55,-55 55,55 -55,55 -55,-55